# Altium footprint library Apalis Evaluation Board.PcbLib: 212 footprints (part 3 of 14)
Each footprint in its own frame and in the unit in brackets; x right, y up, seen from the top. Pads: shape width x height; smd on the part's side, far side on the other; paste and mask are expansions set on the pad; w line width, h text height; cw(c..) or ccw(c..) is an arc to the next point about the centre after c.
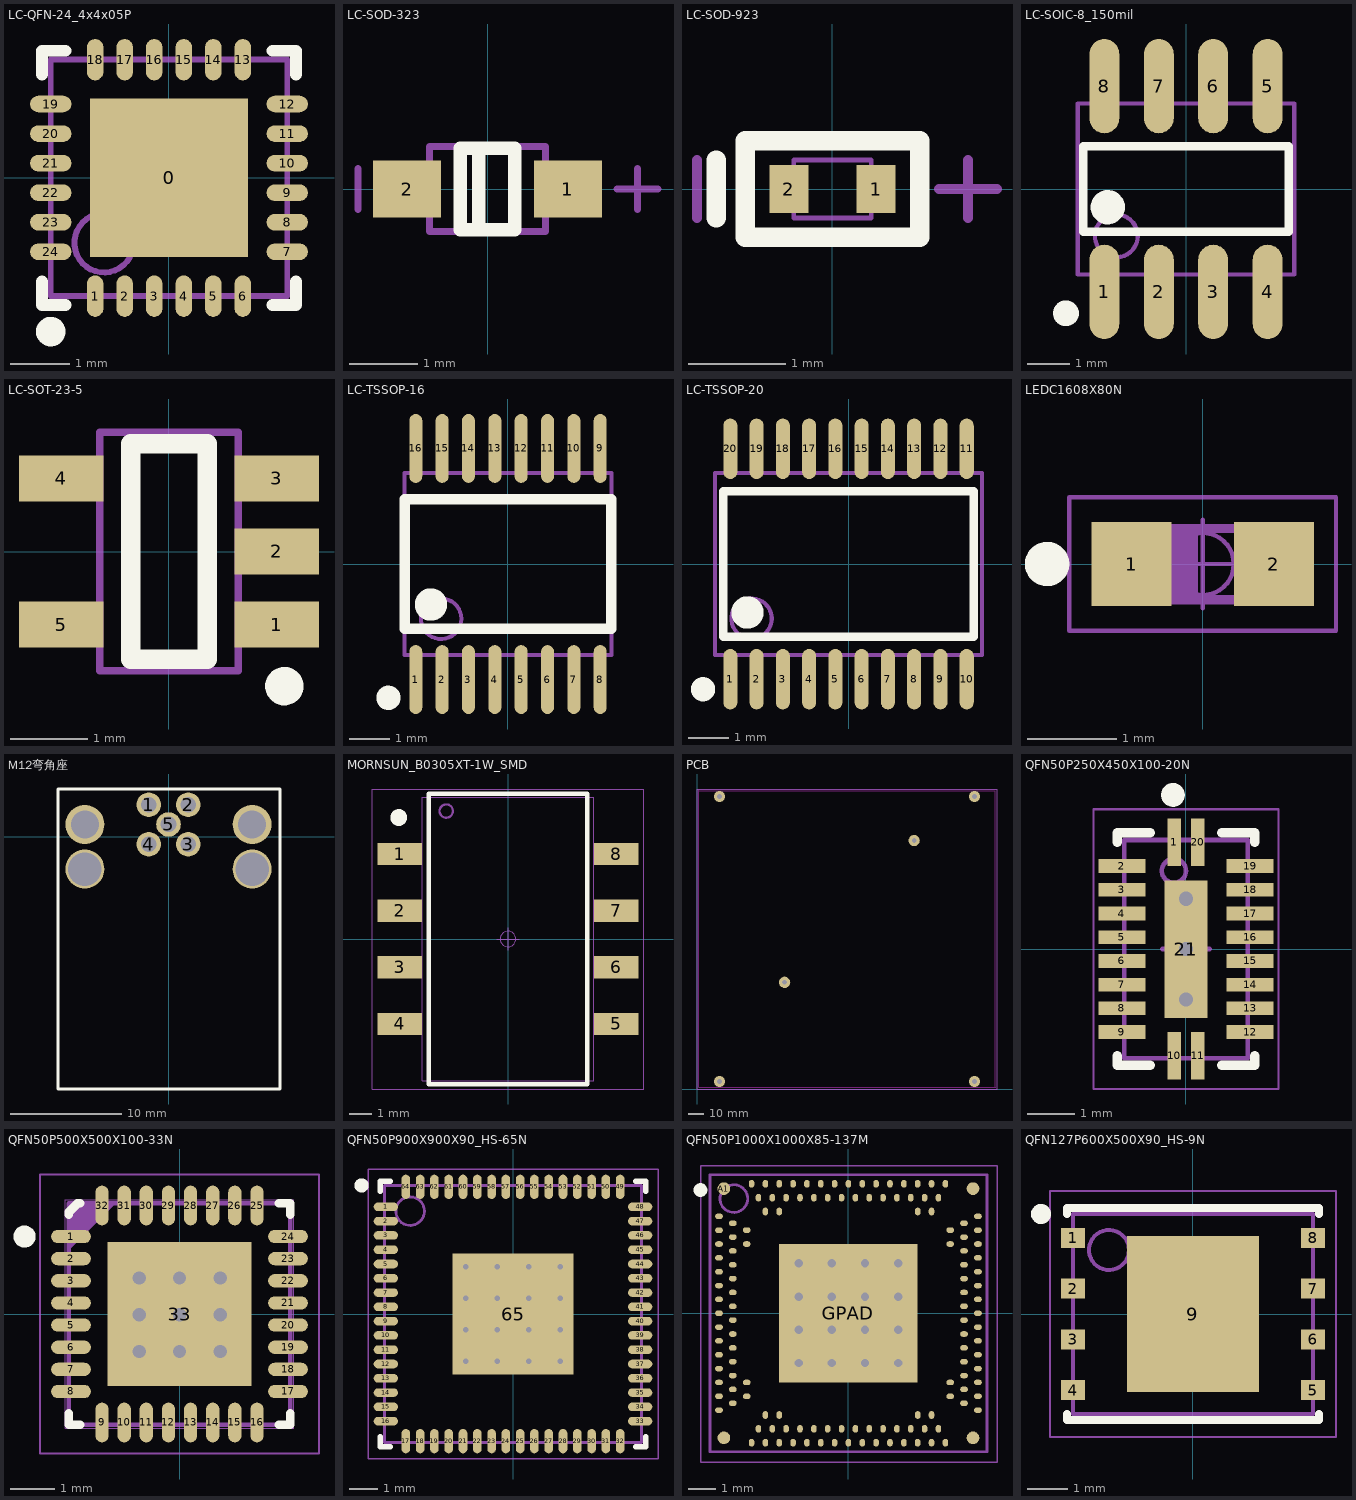
[diagram p2: the footprints below, top view; thin cyan lines are the x and y axes]

## LC-QFN-24_4x4x05P [mm] "CP2105,"
height 0.75
pads (25):
  rect 2.68x2.68 smd mask+0.051: 0(0,0)
  oval 0.28x0.7 smd mask+0.051: 1(-1.25,-2) 2(-0.75,-2) 3(-0.25,-2) 4(0.25,-2) 5(0.75,-2) 6(1.25,-2) 13(1.25,2) 14(0.75,2) 15(0.25,2) 16(-0.25,2) 17(-0.75,2) 18(-1.25,2)
  oval 0.7x0.28 smd mask+0.051: 7(2,-1.25) 8(2,-0.75) 9(2,-0.25) 10(2,0.25) 11(2,0.75) 12(2,1.25) 19(-2,1.25) 20(-2,0.75) 21(-2,0.25) 22(-2,-0.25) 23(-2,-0.75) 24(-2,-1.25)
Top Overlay:
  circle w0.25: c-2,-2.6 r0.125
  lines w0.2: -2.15,-1.75 -2.15,-2.15 -1.75,-2.15 ; -2.15,1.75 -2.15,2.15 -1.75,2.15 ; 1.75,-2.15 2.15,-2.15 2.15,-1.75 ; 1.75,2.15 2.15,2.15 2.15,1.75
Mechanical 13:
  circle w0.1: c-1.1,-1.1 r0.5
  lines w0.1: -2,-2 2,-2 2,2 -2,2 -2,-2

## LC-SOD-323 [mm]
pads (2):
  rect 1x0.83 smd: 1(1.18,0) 2(-1.18,0)
Top Overlay:
  lines w0.2: -0.13,-0.6 -0.13,0.6 ; -0.4,-0.6 0.4,-0.6 0.4,0.6 -0.4,0.6 -0.4,-0.6
Mechanical 13:
  lines w0.1: -0.85,-0.625 0.85,-0.625 0.85,0.625 -0.85,0.625 -0.85,-0.625
Mechanical 15:
  lines w0.1: -1.9,-0.3 -1.9,0.3 ; 1.9,0 2.5,0 ; 2.2,-0.3 2.2,0.3
3D body "SOD323.STEP": height 1.1, standoff 0, extent -1.35,-0.625 1.35,0.625

## LC-SOD-923 [mm]
pads (2):
  rect 0.4x0.5 smd: 1(0.45,0) 2(-0.45,0)
Top Overlay:
  lines w0.2: -1.2,-0.3 -1.2,0.3 ; -0.9,-0.5 -0.9,0.5 0.9,0.5 0.9,-0.5 -0.9,-0.5
Mechanical 13:
  lines w0.05: -0.4,-0.3 -0.4,0.3 0.4,0.3 0.4,-0.3 -0.4,-0.3
Mechanical 15:
  lines w0.1: -1.4,-0.3 -1.4,0.3 ; 1.1,0 1.7,0 ; 1.4,-0.3 1.4,0.3
3D body "SOD923.STEP": height 0.43, standoff 0, extent -0.525,-0.325 0.525,0.325

## LC-SOIC-8_150mil [mm] "ADI-ADM3485EARZ"
height 1.75
pads (8):
  oval 0.7x2.2 smd: 1(-1.905,-2.4) 2(-0.635,-2.4) 3(0.635,-2.4) 4(1.905,-2.4) 5(1.905,2.4) 6(0.635,2.4) 7(-0.635,2.4) 8(-1.905,2.4)
Top Overlay:
  circle w0.3: c-2.8,-2.9 r0.15
  circle w0.4: c-1.825,-0.425 r0.2
  lines w0.2: -2.4,-1 2.4,-1 2.4,1 -2.4,1 -2.4,-1
Mechanical 13:
  circle w0.1: c-1.625,-1.095 r0.5
  lines w0.1: -2.525,-1.995 2.525,-1.995 2.525,1.995 -2.525,1.995 -2.525,-1.995

## LC-SOT-23-5 [mm] "SGM2019"
height 1.25
pads (5):
  rect 1.1x0.6 smd: 1(1.4,-0.95) 2(1.4,0) 3(1.4,0.95) 4(-1.4,0.95) 5(-1.4,-0.95)
Top Overlay:
  circle w0.25: c1.5,-1.75 r0.125
  lines w0.254: -0.5,-1.4 0.5,-1.4 0.5,1.4 -0.5,1.4 -0.5,-1.4
Mechanical 13:
  lines w0.1: -0.9,-1.55 -0.9,1.55 0.9,1.55 0.9,-1.55 -0.9,-1.55

## LC-TSSOP-16 [mm] "MAXIM-MAX3232EUE+"
height 1.1
pads (16):
  oval 0.32x1.7 smd: 1(-2.275,-2.85) 2(-1.625,-2.85) 3(-0.975,-2.85) 4(-0.325,-2.85) 5(0.325,-2.85) 6(0.975,-2.85) 7(1.625,-2.85) 8(2.275,-2.85) 9(2.275,2.85) 10(1.625,2.85) 11(0.975,2.85) 12(0.325,2.85) 13(-0.325,2.85) 14(-0.975,2.85) 15(-1.625,2.85) 16(-2.275,2.85)
Top Overlay:
  circle w0.4: c-1.9,-1 r0.2
  circle w0.3: c-2.95,-3.3 r0.15
  lines w0.254: -2.55,-1.6 2.55,-1.6 2.55,1.6 -2.55,1.6 -2.55,-1.6
Mechanical 13:
  circle w0.1: c-1.65,-1.35 r0.5
  lines w0.1: -2.55,-2.25 2.55,-2.25 2.55,2.25 -2.55,2.25 -2.55,-2.25
3D body: height 0.25, standoff 0, extent 1.118,-0.914 1.118,-0.914
3D body "User Library-TSSOP-16-2.STEP": height 1.2, standoff 0, extent -2.5,-3.047 2.5,3.353

## LC-TSSOP-20 [mm] "6.6x6.6xP0.65-20N"
height 1.2
pads (20):
  oval 0.35x1.5 smd: 1(-2.925,-2.85) 2(-2.275,-2.85) 3(-1.625,-2.85) 4(-0.975,-2.85) 5(-0.325,-2.85) 6(0.325,-2.85) 7(0.975,-2.85) 8(1.625,-2.85) 9(2.275,-2.85) 10(2.925,-2.85) 11(2.925,2.85) 12(2.275,2.85) 13(1.625,2.85) 14(0.975,2.85) 15(0.325,2.85) 16(-0.325,2.85) 17(-0.975,2.85) 18(-1.625,2.85) 19(-2.275,2.85) 20(-2.925,2.85)
Top Overlay:
  circle w0.3: c-3.6,-3.1 r0.15
  circle w0.4: c-2.5,-1.2 r0.2
  lines w0.2: -3.1,-1.8 -3.1,1.8 3.1,1.8 3.1,-1.8 -3.1,-1.8
Mechanical 13:
  circle w0.1: c-2.4,-1.35 r0.5
  lines w0.1: -3.3,-2.25 -3.3,2.25 3.3,2.25 3.3,-2.25 -3.3,-2.25

## LEDC1608X80N [mm]
height 0.8
pads (2):
  rect 0.9x0.95 smd: 1(-0.8,0) 2(0.8,0)
Top Overlay:
  circle w0.25: c-1.75,0 r0.125
Mechanical 1:
  circle w0.05: c0,0 r0.35
  lines w0.05: -0.5,0 0.5,0 ; 0,-0.5 0,0.5 ; -1.5,-0.75 1.5,-0.75 1.5,0.75 -1.5,0.75 -1.5,-0.75
Mechanical 2:
  lines w0.001: -0.9,-0.45 0.9,-0.45 0.9,0.45 -0.9,0.45 -0.9,-0.45
Mechanical 3:
  lines w0.1: -0.7,-0.4 -0.7,0.4 ; -0.6,-0.4 -0.6,0.4 ; -0.5,-0.4 -0.5,0.4 ; -0.4,-0.4 -0.4,0.4 ; -0.3,-0.4 -0.3,0.4 ; -0.2,-0.4 -0.2,0.4 ; -0.1,-0.4 -0.1,0.4 ; -0.8,-0.4 0.8,-0.4 0.8,0.4 -0.8,0.4 ; -0.8,-0.4 -0.8,0.4 ; -0.8,-0.4 -0.8,0.4

## M12弯角座 [mm]
pads (9):
  round 2.2 hole 1.4: 1(-1.77,2.885) 2(1.77,2.885) 3(1.77,-0.655) 4(-1.77,-0.655) 5(0,1.115)
  round 3.5 hole 3: ""(-7.5,-2.885) ""(7.5,-2.885)
  round 3.5 hole 2.5: ""(-7.5,1.115) ""(7.5,1.115)
Top Overlay:
  lines w0.254: -9.913,-22.599 9.974,-22.599 10,-22.573 10,-14.913 10,1.115 10,3.808 10,4.264 9.974,4.29 9.518,4.29 6.825,4.29 -9.405,4.29 -9.913,4.29 -9.913,-22.599

## MORNSUN_B0305XT-1W_SMD [mm] "MORNSUN Isolated DC/DC converter"
height 6.25
pads (8):
  rect 2x1 smd: 1(-4.85,3.81) 2(-4.85,1.27) 3(-4.85,-1.27) 4(-4.85,-3.81) 5(4.85,-3.81) 6(4.85,-1.27) 7(4.85,1.27) 8(4.85,3.81)
Top Overlay:
  circle w0.5: c-4.905,5.45 r0.125
  lines w0.2: -3.56,-6.51 -3.56,6.51 3.56,6.51 3.56,-6.51 -3.56,-6.51
Mechanical 1:
  circle w0.05: c0,0 r0.35
  lines w0.05: -0.5,0 0.5,0 ; 0,-0.5 0,0.5 ; -6.08,-6.73 -6.08,6.73 6.08,6.73 6.08,-6.73 -6.08,-6.73
Mechanical 2:
  lines w0.001: -3.85,-6.35 -3.85,6.35 3.85,6.35 3.85,-6.35 -3.85,-6.35
Mechanical 3:
  circle w0.1: c-2.77,5.74 r0.3
  lines w0.1: -3.56,-6.51 3.56,-6.51 3.56,6.51 -3.56,6.51 -3.56,-6.51
3D body: height 6.6, standoff 0, extent -3.85,-6.35 3.85,6.35

## PCB [mm] "PCB Holes"
pads (6):
  round 7.5 hole 3.2: ""(15,195) ""(15,5) ""(58.42,71.12) ""(144.78,165.608) ""(185,195) ""(185,5)
Keep-Out Layer:
  lines w0.01: 1,1 1,199 199,199 199,1 1,1
Mechanical 15:
  lines w0.01: 0,0 0,200 200,200 200,0 0,0

## QFN50P250X450X100-20N [mm] "QFN, 20-Leads, Body 4.4x2.4mm (max), Pitch 0.50mm, IPC Medium Density"
height 1
pads (21):
  rect 0.29x1 smd: 1(-0.25,2.25) 10(-0.25,-2.25) 11(0.25,-2.25) 20(0.25,2.25)
  rect 1x0.29 smd: 2(-1.35,1.75) 3(-1.35,1.25) 4(-1.35,0.75) 5(-1.35,0.25) 6(-1.35,-0.25) 7(-1.35,-0.75) 8(-1.35,-1.25) 9(-1.35,-1.75) 12(1.35,-1.75) 13(1.35,-1.25) 14(1.35,-0.75) 15(1.35,-0.25) 16(1.35,0.25) 17(1.35,0.75) 18(1.35,1.25) 19(1.35,1.75)
  rect 0.9x2.9 smd paste-2.9: 21(0,0)
via 0,0 diameter 0.6 hole 0.3
via 0,1.062 diameter 0.6 hole 0.3
via 0,-1.062 diameter 0.6 hole 0.3
Top Overlay:
  circle w0.25: c-0.275,3.25 r0.125
  lines w0.2: -1.45,-2.25 -1.45,-2.45 -0.75,-2.45 ; -1.45,2.25 -1.45,2.45 -0.75,2.45 ; 0.75,-2.45 1.45,-2.45 1.45,-2.25 ; 0.75,2.45 1.45,2.45 1.45,2.25
Top Paste:
  region: -0.2,-0.2 -0.2,-0.85 0.2,-0.85 0.2,-0.2
  region: -0.2,0.85 -0.2,0.2 0.2,0.2 0.2,0.85
Mechanical 1:
  lines w0.05: -1.95,-2.95 -1.95,2.95 1.95,2.95 1.95,-2.95 -1.95,-2.95
Mechanical 2:
  lines w0.01: -1.3,-2.3 1.3,-2.3 1.3,2.3 -1.3,2.3 -1.3,-2.3
Mechanical 3:
  circle w0.1: c-0.255,1.65 r0.255
  lines w0.1: -0.5,0 0.5,0 ; 0,-0.5 0,0.5 ; -1.3,-2.3 -1.3,2.3 1.3,2.3 1.3,-2.3 -1.3,-2.3
3D body: height 1, standoff 0.05, extent -1.3,-2.3 1.3,2.3

## QFN50P500X500X100-33N [mm] "QFN-32 5x5"
height 1
pads (33):
  oval 0.9x0.3 smd: 1(-2.45,1.75) 2(-2.45,1.25) 3(-2.45,0.75) 4(-2.45,0.25) 5(-2.45,-0.25) 6(-2.45,-0.75) 7(-2.45,-1.25) 8(-2.45,-1.75) 17(2.45,-1.75) 18(2.45,-1.25) 19(2.45,-0.75) 20(2.45,-0.25) 21(2.45,0.25) 22(2.45,0.75) 23(2.45,1.25) 24(2.45,1.75)
  oval 0.3x0.9 smd: 9(-1.75,-2.45) 10(-1.25,-2.45) 11(-0.75,-2.45) 12(-0.25,-2.45) 13(0.25,-2.45) 14(0.75,-2.45) 15(1.25,-2.45) 16(1.75,-2.45) 25(1.75,2.45) 26(1.25,2.45) 27(0.75,2.45) 28(0.25,2.45) 29(-0.25,2.45) 30(-0.75,2.45) 31(-1.25,2.45) 32(-1.75,2.45)
  rect 3.25x3.25 smd paste-0.595: 33(0,0)
via -0.91,-0.018 diameter 0.6 hole 0.3
via 0,0.811 diameter 0.6 hole 0.3
via -0.91,0.811 diameter 0.6 hole 0.3
via -0.91,-0.847 diameter 0.6 hole 0.3
via 0.918,0.811 diameter 0.6 hole 0.3
via 0.004,-0.018 diameter 0.6 hole 0.3
via 0.918,-0.847 diameter 0.6 hole 0.3
via 0.918,-0.018 diameter 0.6 hole 0.3
via 0,-0.847 diameter 0.6 hole 0.3
Top Overlay:
  circle w0.25: c-3.5,1.75 r0.125
  lines w0.2: -2.5,-2.25 -2.5,-2.5 -2.25,-2.5 ; -2.5,2.25 -2.5,2.3 -2.3,2.5 -2.25,2.5 ; 2.25,-2.5 2.5,-2.5 2.5,-2.25 ; 2.25,2.5 2.5,2.5 2.5,2.25
Mechanical 1:
  circle w0.05: c0,0 r0.35
  lines w0.05: -0.5,0 0.5,0 ; 0,-0.5 0,0.5 ; -3.15,-3.15 3.15,-3.15 3.15,3.15 -3.15,3.15 -3.15,-3.15
Mechanical 2:
  lines w0.001: -2.575,-2.575 2.575,-2.575 2.575,2.575 -2.575,2.575 -2.575,-2.575
Mechanical 3:
  lines w0.1: -2.5,1.5 -1.5,2.5 ; -2.5,1.6 -1.6,2.5 ; -2.5,1.7 -1.7,2.5 ; -2.5,1.8 -1.8,2.5 ; -2.5,1.9 -1.9,2.5 ; -2.5,2 -2,2.5 ; -2.5,2.1 -2.1,2.5 ; -2.5,2.2 -2.2,2.5 ; -2.5,2.3 -2.3,2.5 ; -2.5,2.4 -2.4,2.5 ; -2.5,-2.5 2.5,-2.5 2.5,2.5 -2.5,2.5 -2.5,-2.5
3D body: height 1, standoff 0, extent -2.575,-2.575 2.575,2.575

## QFN50P900X900X90_HS-65N [mm] "QFN, 64-Leads, Body 9.00x9.00mm, Pitch 0.50mm, Thermal Pad 4.25x4.25mm, IPC Medium Density"
height 0.9
pads (65):
  oval 0.85x0.3 smd: 1(-4.45,3.75) 2(-4.45,3.25) 3(-4.45,2.75) 4(-4.45,2.25) 5(-4.45,1.75) 6(-4.45,1.25) 7(-4.45,0.75) 8(-4.45,0.25) 9(-4.45,-0.25) 10(-4.45,-0.75) 11(-4.45,-1.25) 12(-4.45,-1.75) 13(-4.45,-2.25) 14(-4.45,-2.75) 15(-4.45,-3.25) 16(-4.45,-3.75) 33(4.45,-3.75) 34(4.45,-3.25) 35(4.45,-2.75) 36(4.45,-2.25) 37(4.45,-1.75) 38(4.45,-1.25) 39(4.45,-0.75) 40(4.45,-0.25) 41(4.45,0.25) 42(4.45,0.75) 43(4.45,1.25) 44(4.45,1.75) 45(4.45,2.25) 46(4.45,2.75) 47(4.45,3.25) 48(4.45,3.75)
  oval 0.3x0.85 smd: 17(-3.75,-4.45) 18(-3.25,-4.45) 19(-2.75,-4.45) 20(-2.25,-4.45) 21(-1.75,-4.45) 22(-1.25,-4.45) 23(-0.75,-4.45) 24(-0.25,-4.45) 25(0.25,-4.45) 26(0.75,-4.45) 27(1.25,-4.45) 28(1.75,-4.45) 29(2.25,-4.45) 30(2.75,-4.45) 31(3.25,-4.45) 32(3.75,-4.45) 49(3.75,4.45) 50(3.25,4.45) 51(2.75,4.45) 52(2.25,4.45) 53(1.75,4.45) 54(1.25,4.45) 55(0.75,4.45) 56(0.25,4.45) 57(-0.25,4.45) 58(-0.75,4.45) 59(-1.25,4.45) 60(-1.75,4.45) 61(-2.25,4.45) 62(-2.75,4.45) 63(-3.25,4.45) 64(-3.75,4.45)
  rect 4.25x4.25 smd: 65(0,0)
via -1.65,1.65 diameter 0.5 hole 0.2
via -0.55,1.65 diameter 0.5 hole 0.2
via 0.55,1.65 diameter 0.5 hole 0.2
via 1.65,1.65 diameter 0.5 hole 0.2
via -1.65,0.55 diameter 0.5 hole 0.2
via -0.55,0.55 diameter 0.5 hole 0.2
via 0.55,0.55 diameter 0.5 hole 0.2
via 1.65,0.55 diameter 0.5 hole 0.2
via -1.65,-0.55 diameter 0.5 hole 0.2
via -0.55,-0.55 diameter 0.5 hole 0.2
via 0.55,-0.55 diameter 0.5 hole 0.2
via 1.65,-0.55 diameter 0.5 hole 0.2
via -1.65,-1.65 diameter 0.5 hole 0.2
via -0.55,-1.65 diameter 0.5 hole 0.2
via 0.55,-1.65 diameter 0.5 hole 0.2
via 1.65,-1.65 diameter 0.5 hole 0.2
Top Overlay:
  circle w0.25: c-5.3,4.5 r0.125
  lines w0.2: -4.65,-4.3 -4.65,-4.65 -4.3,-4.65 ; -4.65,4.3 -4.65,4.65 -4.3,4.65 ; 4.3,-4.65 4.65,-4.65 4.65,-4.3 ; 4.3,4.65 4.65,4.65 4.65,4.3
Mechanical 13:
  circle w0.1: c-3.6,3.6 r0.5
  lines w0.1: -4.5,-4.5 -4.5,4.5 4.5,4.5 4.5,-4.5 -4.5,-4.5
Mechanical 15:
  lines w0.05: -5.075,-5.075 -5.075,5.075 5.075,5.075 5.075,-5.075 -5.075,-5.075
  lines w0.1: -0.5,0 0.5,0 ; 0,-0.5 0,0.5
3D body: height 0.9, standoff 0, extent -4.5,-4.5 4.5,4.5

## QFN50P1000X1000X85-137M [mm] "Double Row QFN, 137-Leads, Body 10.0x10.0mm (max), Pitch 0.50mm, IPC Low Density"
height 0.85
pads (137):
  round 0.46 smd: A1(-4.5,4.5) A17(-4.5,-4.5) A33(4.5,-4.5) A49(4.5,4.5)
  oval 0.28x0.2 smd: A2(-4.675,3.5) A3(-4.675,3) A4(-4.675,2.5) A5(-4.675,2) A6(-4.675,1.5) A7(-4.675,1) A8(-4.675,0.5) A9(-4.675,0) A10(-4.675,-0.5) A11(-4.675,-1) A12(-4.675,-1.5) A13(-4.675,-2) A14(-4.675,-2.5) A15(-4.675,-3) A16(-4.675,-3.5) A34(4.675,-3.5) A35(4.675,-3) A36(4.675,-2.5) A37(4.675,-2) A38(4.675,-1.5) A39(4.675,-1) A40(4.675,-0.5) A41(4.675,0) A42(4.675,0.5) A43(4.675,1) A44(4.675,1.5) A45(4.675,2) A46(4.675,2.5) A47(4.675,3) A48(4.675,3.5) B1(-4.175,3.25) B2(-4.175,2.75) B3(-4.175,2.25) B4(-4.175,1.75) B5(-4.175,1.25) B6(-4.175,0.75) B7(-4.175,0.25) B8(-4.175,-0.25) B9(-4.175,-0.75) B10(-4.175,-1.25) B11(-4.175,-1.75) B12(-4.175,-2.25) B13(-4.175,-2.75) B14(-4.175,-3.25) B29(4.175,-3.25) B30(4.175,-2.75) B31(4.175,-2.25) B32(4.175,-1.75) B33(4.175,-1.25) B34(4.175,-0.75) B35(4.175,-0.25) B36(4.175,0.25) B37(4.175,0.75) B38(4.175,1.25) B39(4.175,1.75) B40(4.175,2.25) B41(4.175,2.75) B42(4.175,3.25) C1(-3.675,3) C2(-3.675,2.5) C3(-3.675,-2.5) C4(-3.675,-3) C9(3.675,-3) C10(3.675,-2.5) C11(3.675,2.5) C12(3.675,3)
  oval 0.2x0.28 smd: A18(-3.5,-4.675) A19(-3,-4.675) A20(-2.5,-4.675) A21(-2,-4.675) A22(-1.5,-4.675) A23(-1,-4.675) A24(-0.5,-4.675) A25(0,-4.675) A26(0.5,-4.675) A27(1,-4.675) A28(1.5,-4.675) A29(2,-4.675) A30(2.5,-4.675) A31(3,-4.675) A32(3.5,-4.675) A50(3.5,4.675) A51(3,4.675) A52(2.5,4.675) A53(2,4.675) A54(1.5,4.675) A55(1,4.675) A56(0.5,4.675) A57(0,4.675) A58(-0.5,4.675) A59(-1,4.675) A60(-1.5,4.675) A61(-2,4.675) A62(-2.5,4.675) A63(-3,4.675) A64(-3.5,4.675) B15(-3.25,-4.175) B16(-2.75,-4.175) B17(-2.25,-4.175) B18(-1.75,-4.175) B19(-1.25,-4.175) B20(-0.75,-4.175) B21(-0.25,-4.175) B22(0.25,-4.175) B23(0.75,-4.175) B24(1.25,-4.175) B25(1.75,-4.175) B26(2.25,-4.175) B27(2.75,-4.175) B28(3.25,-4.175) B43(3.25,4.175) B44(2.75,4.175) B45(2.25,4.175) B46(1.75,4.175) B47(1.25,4.175) B48(0.75,4.175) B49(0.25,4.175) B50(-0.25,4.175) B51(-0.75,4.175) B52(-1.25,4.175) B53(-1.75,4.175) B54(-2.25,4.175) B55(-2.75,4.175) B56(-3.25,4.175) C5(-3,-3.675) C6(-2.5,-3.675) C7(2.5,-3.675) C8(3,-3.675) C13(3,3.675) C14(2.5,3.675) C15(-2.5,3.675) C16(-3,3.675)
  rect 5x5 smd paste-5: GPAD(0,0)
via -1.8,1.8 diameter 0.6 hole 0.3
via -0.6,1.8 diameter 0.6 hole 0.3
via 0.6,1.8 diameter 0.6 hole 0.3
via 1.8,1.8 diameter 0.6 hole 0.3
via -1.8,0.6 diameter 0.6 hole 0.3
via -0.6,0.6 diameter 0.6 hole 0.3
via 0.6,0.6 diameter 0.6 hole 0.3
via 1.8,0.6 diameter 0.6 hole 0.3
via -1.8,-0.6 diameter 0.6 hole 0.3
via -0.6,-0.6 diameter 0.6 hole 0.3
via 0.6,-0.6 diameter 0.6 hole 0.3
via 1.8,-0.6 diameter 0.6 hole 0.3
via -1.8,-1.8 diameter 0.6 hole 0.3
via -0.6,-1.8 diameter 0.6 hole 0.3
via 0.6,-1.8 diameter 0.6 hole 0.3
via 1.8,-1.8 diameter 0.6 hole 0.3
Top Overlay:
  circle w0.25: c-5.345,4.45 r0.125
Top Paste:
  region: -1.425,1.425 -1.425,0.16 -0.16,0.16 -0.16,1.425
  region: -1.425,-1.425 -0.16,-1.425 -0.16,-0.16 -1.425,-0.16
  region: 1.425,-1.425 1.425,-0.16 0.16,-0.16 0.16,-1.425
  region: 1.425,1.425 0.16,1.425 0.16,0.16 1.425,0.16
Mechanical 1:
  lines w0.05: -5.335,-5.39 -5.335,5.335 5.365,5.335 5.365,-5.39 -5.335,-5.39
  lines w0.1: -0.5,0 0.5,0 ; 0,-0.5 0,0.5
Mechanical 2:
  lines w0.001: -5,-5 5,-5 5,5 -5,5 -5,-5
Mechanical 3:
  circle w0.1: c-4.14,4.14 r0.5
  lines w0.1: -5,-5 5,-5 5,5 -5,5 -5,-5
3D body: height 0.85, standoff 0.12, extent -5,-5 5,5

## QFN127P600X500X90_HS-9N [mm] "QFN, 8-Leads, Body 6.00x5.00mm, Pitch 1.27mm, Thermal Pad 3.30x3.90mm, IPC Medium Density"
height 0.9
pads (9):
  rect 0.6x0.5 smd: 1(-3,1.905) 2(-3,0.635) 3(-3,-0.635) 4(-3,-1.905) 5(3,-1.905) 6(3,-0.635) 7(3,0.635) 8(3,1.905)
  rect 3.3x3.9 smd: 9(0,0)
Top Overlay:
  circle w0.25: c-3.8,2.5 r0.125
  lines w0.2: -3.15,-2.505 -3.15,-2.65 0.035,-2.65 ; -3.15,2.505 -3.15,2.65 0.035,2.65 ; -0.035,-2.65 3.15,-2.65 3.15,-2.505 ; -0.035,2.65 3.15,2.65 3.15,2.505
Mechanical 13:
  circle w0.1: c-2.1,1.6 r0.5
  lines w0.1: -3,-2.5 -3,2.5 3,2.5 3,-2.5 -3,-2.5
Mechanical 15:
  lines w0.05: -3.575,-3.075 -3.575,3.075 3.575,3.075 3.575,-3.075 -3.575,-3.075
  lines w0.1: -0.5,0 0.5,0 ; 0,-0.5 0,0.5
3D body: height 0.9, standoff 0, extent -3,-2.5 3,2.5